# Altium footprint library 逸芬的库鸭.PcbLib: 255 footprints (part 10 of 20)
Each footprint in its own frame and in the unit in brackets; x right, y up, seen from the top. Pads: shape width x height; smd on the part's side, far side on the other; paste and mask are expansions set on the pad; w line width, h text height; cw(c..) or ccw(c..) is an arc to the next point about the centre after c.
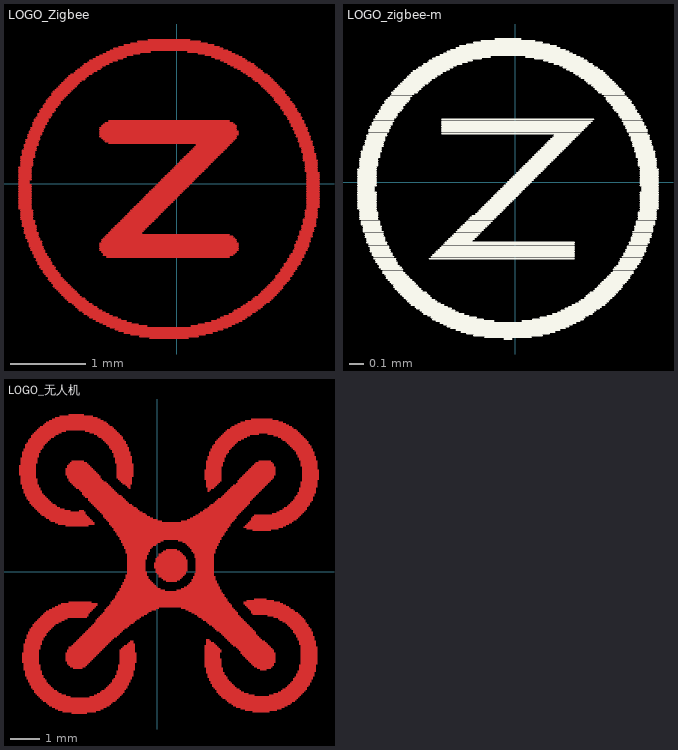
[diagram p9: the footprints below, top view; thin cyan lines are the x and y axes]

## LOGO_Zigbee [mm]
Top Layer:
  lines w0.023: -2.09,-0.33 -1.93,-0.33 ; -2.09,-0.307 -1.93,-0.307 ; -2.09,-0.284 -1.93,-0.284 ; -2.09,-0.262 -1.93,-0.262 ; -2.09,-0.239 -1.93,-0.239 ; -2.09,-0.216 -1.93,-0.216 ; -2.09,-0.193 -1.93,-0.193 ; -2.09,-0.17 -1.93,-0.17 ; -2.09,-0.147 -1.93,-0.147 ; -2.09,-0.124 -1.93,-0.124 ; -2.09,-0.102 -1.93,-0.102 ; -2.09,-0.079 -1.93,-0.079 ; -2.09,-0.056 -1.93,-0.056 ; -2.09,-0.033 -1.93,-0.033 ; -2.09,-0.01 -1.93,-0.01 ; -2.09,0.013 -1.953,0.013 ; -2.09,0.036 -1.953,0.036 ; -2.09,0.058 -1.93,0.058 ; -2.09,0.081 -1.93,0.081 ; -2.09,0.104 -1.93,0.104 ; -2.09,0.127 -1.93,0.127 ; -2.09,0.15 -1.93,0.15 ; -2.09,0.173 -1.93,0.173 ; -2.09,0.196 -1.93,0.196 ; -2.09,0.218 -1.93,0.218 ; -2.068,-0.467 -1.908,-0.467 ; -2.068,-0.445 -1.908,-0.445 ; -2.068,-0.422 -1.908,-0.422 ; -2.068,-0.399 -1.908,-0.399 ; -2.068,-0.376 -1.908,-0.376 ; -2.068,-0.353 -1.908,-0.353 ; -2.068,0.241 -1.908,0.241 ; -2.068,0.264 -1.908,0.264 ; -2.068,0.287 -1.908,0.287 ; -2.068,0.31 -1.908,0.31 ; -2.068,0.333 -1.908,0.333 ; -2.068,0.356 -1.885,0.356 ; -2.045,-0.559 -1.862,-0.559 ; -2.045,-0.536 -1.885,-0.536 ; -2.045,-0.513 -1.885,-0.513 ; -2.045,-0.49 -1.885,-0.49 ; -2.045,0.378 -1.885,0.378 ; -2.045,0.401 -1.885,0.401 ; -2.045,0.424 -1.885,0.424 ; -2.045,0.447 -1.862,0.447 ; -2.022,-0.65 -1.839,-0.65 ; -2.022,-0.627 -1.862,-0.627 ; -2.022,-0.605 -1.862,-0.605 ; -2.022,-0.582 -1.862,-0.582 ; -2.022,0.47 -1.862,0.47 ; -2.022,0.493 -1.862,0.493 ; -2.022,0.516 -1.839,0.516 ; -1.999,-0.719 -1.816,-0.719 ; -1.999,-0.696 -1.839,-0.696 ; -1.999,-0.673 -1.839,-0.673 ; -1.999,0.538 -1.839,0.538 ; -1.999,0.561 -1.839,0.561 ; -1.999,0.584 -1.816,0.584 ; -1.976,-0.765 -1.793,-0.765 ; -1.976,-0.742 -1.816,-0.742 ; -1.976,0.607 -1.816,0.607 ; -1.976,0.63 -1.816,0.63 ; -1.976,0.653 -1.793,0.653 ; -1.953,-0.833 -1.77,-0.833 ; -1.953,-0.81 -1.793,-0.81 ; -1.953,-0.787 -1.793,-0.787 ; -1.953,0.676 -1.793,0.676 ; -1.953,0.699 -1.77,0.699 ; -1.93,-0.879 -1.748,-0.879 ; -1.93,-0.856 -1.77,-0.856 ; -1.93,0.721 -1.77,0.721 ; -1.93,0.744 -1.748,0.744 ; -1.908,-0.925 -1.725,-0.925 ; -1.908,-0.902 -1.748,-0.902 ; -1.908,0.767 -1.748,0.767 ; -1.908,0.79 -1.725,0.79 ; -1.908,0.813 -1.725,0.813 ; -1.885,-0.97 -1.702,-0.97 ; -1.885,-0.947 -1.725,-0.947 ; -1.885,0.836 -1.702,0.836 ; -1.885,0.859 -1.702,0.859 ; -1.862,-1.016 -1.679,-1.016 ; -1.862,-0.993 -1.679,-0.993 ; -1.862,0.881 -1.679,0.881 ; -1.839,-1.062 -1.656,-1.062 ; -1.839,-1.039 -1.656,-1.039 ; -1.839,0.904 -1.656,0.904 ; -1.839,0.927 -1.656,0.927 ; -1.816,-1.107 -1.61,-1.107 ; -1.816,-1.085 -1.633,-1.085 ; -1.816,0.95 -1.633,0.95 ; -1.816,0.973 -1.61,0.973 ; -1.793,-1.13 -1.61,-1.13 ; -1.793,0.996 -1.61,0.996 ; -1.77,-1.176 -1.565,-1.176 ; -1.77,-1.153 -1.587,-1.153 ; -1.77,1.019 -1.587,1.019 ; -1.77,1.041 -1.565,1.041 ; -1.748,-1.199 -1.542,-1.199 ; -1.748,1.064 -1.542,1.064 ; -1.725,-1.222 -1.542,-1.222 ; -1.725,1.087 -1.542,1.087 ; -1.725,1.11 -1.519,1.11 ; -1.702,-1.267 -1.496,-1.267 ; -1.702,-1.245 -1.519,-1.245 ; -1.702,1.133 -1.496,1.133 ; -1.679,-1.29 -1.473,-1.29 ; -1.679,1.156 -1.473,1.156 ; -1.656,-1.313 -1.45,-1.313 ; -1.656,1.179 -1.45,1.179 ; -1.656,1.201 -1.427,1.201 ; -1.633,-1.359 -1.405,-1.359 ; -1.633,-1.336 -1.427,-1.336 ; -1.633,1.224 -1.405,1.224 ; -1.61,-1.382 -1.382,-1.382 ; -1.61,1.247 -1.382,1.247 ; -1.587,-1.405 -1.359,-1.405 ; -1.587,1.27 -1.359,1.27 ; -1.565,-1.427 -1.336,-1.427 ; -1.565,1.293 -1.336,1.293 ; -1.542,-1.45 -1.313,-1.45 ; -1.542,1.316 -1.313,1.316 ; -1.519,-1.473 -1.29,-1.473 ; -1.519,1.339 -1.29,1.339 ; -1.496,-1.496 -1.267,-1.496 ; -1.496,1.361 -1.267,1.361 ; -1.473,-1.519 -1.222,-1.519 ; -1.473,1.384 -1.222,1.384 ; -1.45,-1.542 -1.199,-1.542 ; -1.45,1.407 -1.199,1.407 ; -1.427,-1.565 -1.176,-1.565 ; -1.427,1.43 -1.176,1.43 ; -1.405,1.453 -1.13,1.453 ; -1.382,-1.587 -1.13,-1.587 ; -1.359,-1.61 -1.107,-1.61 ; -1.359,1.476 -1.107,1.476 ; -1.336,-1.633 -1.062,-1.633 ; -1.336,1.499 -1.062,1.499 ; -1.313,-1.656 -1.039,-1.656 ; -1.313,1.521 -1.016,1.521 ; -1.29,-1.679 -0.993,-1.679 ; -1.267,1.544 -0.993,1.544 ; -1.245,-1.702 -0.947,-1.702 ; -1.245,1.567 -0.947,1.567 ; -1.222,-1.725 -0.902,-1.725 ; -1.222,1.59 -0.902,1.59 ; -1.176,-1.748 -0.856,-1.748 ; -1.176,1.613 -0.856,1.613 ; -1.153,-1.77 -0.787,-1.77 ; -1.153,1.636 -0.787,1.636 ; -1.107,-1.793 -0.742,-1.793 ; -1.107,1.659 -0.719,1.659 ; -1.062,-1.816 -0.673,-1.816 ; -1.062,1.681 -0.673,1.681 ; -1.016,-1.839 -0.605,-1.839 ; -1.016,-0.879 0.813,-0.879 ; -1.016,-0.856 0.813,-0.856 ; -1.016,-0.833 0.813,-0.833 ; -1.016,-0.81 0.813,-0.81 ; -1.016,-0.787 0.813,-0.787 ; -1.016,0.63 0.79,0.63 ; -1.016,0.653 0.813,0.653 ; -1.016,0.676 0.813,0.676 ; -1.016,0.699 0.813,0.699 ; -1.016,0.721 0.79,0.721 ; -1.016,0.744 0.79,0.744 ; -1.016,1.704 -0.582,1.704 ; -0.993,-0.902 0.79,-0.902 ; -0.993,-0.765 0.79,-0.765 ; -0.993,-0.742 0.79,-0.742 ; -0.993,0.607 0.79,0.607 ; -0.993,0.767 0.79,0.767 ; -0.97,-1.862 -0.513,-1.862 ; -0.97,-0.947 0.744,-0.947 ; -0.97,-0.925 0.767,-0.925 ; -0.97,-0.719 0.767,-0.719 ; -0.97,0.584 0.767,0.584 ; -0.97,0.79 0.767,0.79 ; -0.97,1.727 -0.49,1.727 ; -0.947,-0.696 0.744,-0.696 ; -0.947,0.561 0.744,0.561 ; -0.947,0.813 0.744,0.813 ; -0.925,-1.885 -0.399,-1.885 ; -0.925,-0.97 0.699,-0.97 ; -0.925,-0.673 0.699,-0.673 ; -0.925,1.75 -0.353,1.75 ; -0.902,-0.65 -0.467,-0.65 ; -0.902,0.538 0.721,0.538 ; -0.902,0.836 0.699,0.836 ; -0.879,-1.908 0.676,-1.908 ; -0.879,-0.627 -0.445,-0.627 ; -0.879,1.773 0.676,1.773 ; -0.856,-0.605 -0.422,-0.605 ; -0.833,-0.582 -0.399,-0.582 ; -0.833,1.796 0.607,1.796 ; -0.81,-1.93 0.607,-1.93 ; -0.81,-0.559 -0.376,-0.559 ; -0.787,-0.536 -0.353,-0.536 ; -0.765,-1.953 0.538,-1.953 ; -0.765,-0.513 -0.33,-0.513 ; -0.765,1.819 0.561,1.819 ; -0.742,-0.49 -0.307,-0.49 ; -0.719,-0.467 -0.284,-0.467 ; -0.696,-1.976 0.47,-1.976 ; -0.696,-0.445 -0.262,-0.445 ; -0.696,1.841 0.493,1.841 ; -0.673,-0.422 -0.239,-0.422 ; -0.65,-0.399 -0.216,-0.399 ; -0.627,-0.376 -0.193,-0.376 ; -0.605,-1.999 0.378,-1.999 ; -0.605,-0.353 -0.17,-0.353 ; -0.605,1.864 0.401,1.864 ; -0.582,-0.33 -0.147,-0.33 ; -0.559,-0.307 -0.124,-0.307 ; -0.536,-0.284 -0.102,-0.284 ; -0.513,-0.262 -0.079,-0.262 ; -0.513,1.887 0.31,1.887 ; -0.49,-2.022 0.287,-2.022 ; -0.49,-0.239 -0.056,-0.239 ; -0.467,-0.216 -0.033,-0.216 ; -0.445,-0.193 -0.01,-0.193 ; -0.422,-0.17 0.013,-0.17 ; -0.399,-0.147 0.036,-0.147 ; -0.376,-0.124 0.058,-0.124 ; -0.376,1.91 0.173,1.91 ; -0.353,-2.045 0.15,-2.045 ; -0.353,-0.102 0.081,-0.102 ; -0.33,-0.079 0.104,-0.079 ; -0.307,-0.056 0.127,-0.056 ; -0.284,-0.033 0.15,-0.033 ; -0.262,-0.01 0.173,-0.01 ; -0.239,0.013 0.196,0.013 ; -0.216,0.036 0.218,0.036 ; -0.193,0.058 0.241,0.058 ; -0.17,0.081 0.264,0.081 ; -0.147,0.104 0.287,0.104 ; -0.124,0.127 0.31,0.127 ; -0.102,0.15 0.333,0.15 ; -0.079,0.173 0.356,0.173 ; -0.056,0.196 0.378,0.196 ; -0.033,0.218 0.401,0.218 ; -0.01,0.241 0.424,0.241 ; 0.013,0.264 0.447,0.264 ; 0.036,0.287 0.47,0.287 ; 0.058,0.31 0.493,0.31 ; 0.081,0.333 0.516,0.333 ; 0.104,0.356 0.538,0.356 ; 0.127,0.378 0.561,0.378 ; 0.15,0.401 0.584,0.401 ; 0.15,1.75 0.721,1.75 ; 0.173,0.424 0.607,0.424 ; 0.196,-1.885 0.721,-1.885 ; 0.196,0.447 0.63,0.447 ; 0.218,0.47 0.653,0.47 ; 0.241,0.493 0.676,0.493 ; 0.264,0.516 0.699,0.516 ; 0.287,-1.862 0.767,-1.862 ; 0.287,1.727 0.767,1.727 ; 0.378,-1.839 0.813,-1.839 ; 0.378,1.704 0.813,1.704 ; 0.47,-1.816 0.859,-1.816 ; 0.47,1.681 0.859,1.681 ; 0.516,1.659 0.904,1.659 ; 0.538,-1.793 0.904,-1.793 ; 0.584,-1.77 0.927,-1.77 ; 0.584,1.636 0.927,1.636 ; 0.63,-1.748 0.973,-1.748 ; 0.63,1.613 0.973,1.613 ; 0.676,1.59 1.019,1.59 ; 0.699,-1.725 0.996,-1.725 ; 0.721,1.567 1.041,1.567 ; 0.744,-1.702 1.041,-1.702 ; 0.767,-1.679 1.064,-1.679 ; 0.767,1.544 1.064,1.544 ; 0.813,-1.656 1.11,-1.656 ; 0.813,1.521 1.11,1.521 ; 0.859,-1.633 1.133,-1.633 ; 0.859,1.499 1.133,1.499 ; 0.881,-1.61 1.156,-1.61 ; 0.881,1.476 1.156,1.476 ; 0.927,-1.587 1.179,-1.587 ; 0.927,1.453 1.201,1.453 ; 0.95,-1.565 1.224,-1.565 ; 0.95,1.43 1.224,1.43 ; 0.996,-1.542 1.247,-1.542 ; 0.996,1.407 1.247,1.407 ; 1.019,-1.519 1.27,-1.519 ; 1.019,1.384 1.27,1.384 ; 1.041,-1.496 1.293,-1.496 ; 1.041,1.361 1.293,1.361 ; 1.087,-1.473 1.316,-1.473 ; 1.087,1.339 1.316,1.339 ; 1.11,-1.45 1.339,-1.45 ; 1.11,1.316 1.339,1.316 ; 1.133,-1.427 1.361,-1.427 ; 1.133,1.293 1.361,1.293 ; 1.156,-1.405 1.384,-1.405 ; 1.156,1.27 1.384,1.27 ; 1.179,-1.382 1.407,-1.382 ; 1.179,1.247 1.407,1.247 ; 1.201,-1.359 1.407,-1.359 ; 1.201,1.224 1.43,1.224 ; 1.224,-1.336 1.43,-1.336 ; 1.224,1.201 1.43,1.201 ; 1.247,-1.313 1.453,-1.313 ; 1.247,1.179 1.453,1.179 ; 1.27,-1.29 1.476,-1.29 ; 1.27,1.156 1.476,1.156 ; 1.293,-1.267 1.499,-1.267 ; 1.293,1.11 1.499,1.11 ; 1.293,1.133 1.499,1.133 ; 1.316,-1.245 1.499,-1.245 ; 1.316,-1.222 1.521,-1.222 ; 1.316,1.087 1.521,1.087 ; 1.339,-1.199 1.544,-1.199 ; 1.339,1.064 1.544,1.064 ; 1.361,-1.176 1.544,-1.176 ; 1.361,1.041 1.567,1.041 ; 1.384,-1.153 1.567,-1.153 ; 1.384,-1.13 1.59,-1.13 ; 1.384,0.996 1.59,0.996 ; 1.384,1.019 1.567,1.019 ; 1.407,-1.107 1.59,-1.107 ; 1.407,0.973 1.59,0.973 ; 1.43,-1.085 1.613,-1.085 ; 1.43,-1.062 1.636,-1.062 ; 1.43,0.927 1.636,0.927 ; 1.43,0.95 1.613,0.95 ; 1.453,-1.039 1.636,-1.039 ; 1.453,0.904 1.636,0.904 ; 1.476,-1.016 1.659,-1.016 ; 1.476,-0.993 1.659,-0.993 ; 1.476,0.859 1.659,0.859 ; 1.476,0.881 1.659,0.881 ; 1.499,-0.97 1.681,-0.97 ; 1.499,-0.947 1.681,-0.947 ; 1.499,0.813 1.681,0.813 ; 1.499,0.836 1.681,0.836 ; 1.521,-0.925 1.704,-0.925 ; 1.521,0.767 1.704,0.767 ; 1.521,0.79 1.704,0.79 ; 1.544,-0.902 1.704,-0.902 ; 1.544,-0.879 1.727,-0.879 ; 1.544,0.721 1.727,0.721 ; 1.544,0.744 1.727,0.744 ; 1.567,-0.856 1.727,-0.856 ; 1.567,-0.833 1.75,-0.833 ; 1.567,-0.81 1.75,-0.81 ; 1.567,0.676 1.75,0.676 ; 1.567,0.699 1.727,0.699 ; 1.59,-0.787 1.75,-0.787 ; 1.59,-0.765 1.773,-0.765 ; 1.59,0.63 1.773,0.63 ; 1.59,0.653 1.75,0.653 ; 1.613,-0.742 1.773,-0.742 ; 1.613,-0.719 1.773,-0.719 ; 1.613,-0.696 1.796,-0.696 ; 1.613,0.561 1.796,0.561 ; 1.613,0.584 1.773,0.584 ; 1.613,0.607 1.773,0.607 ; 1.636,-0.673 1.796,-0.673 ; 1.636,-0.65 1.796,-0.65 ; 1.636,-0.627 1.819,-0.627 ; 1.636,0.493 1.819,0.493 ; 1.636,0.516 1.796,0.516 ; 1.636,0.538 1.796,0.538 ; 1.659,-0.605 1.819,-0.605 ; 1.659,-0.582 1.819,-0.582 ; 1.659,-0.559 1.841,-0.559 ; 1.659,0.424 1.819,0.424 ; 1.659,0.447 1.819,0.447 ; 1.659,0.47 1.819,0.47 ; 1.681,-0.536 1.841,-0.536 ; 1.681,-0.513 1.841,-0.513 ; 1.681,-0.49 1.841,-0.49 ; 1.681,-0.467 1.841,-0.467 ; 1.681,0.31 1.864,0.31 ; 1.681,0.333 1.841,0.333 ; 1.681,0.356 1.841,0.356 ; 1.681,0.378 1.841,0.378 ; 1.681,0.401 1.841,0.401 ; 1.704,-0.445 1.864,-0.445 ; 1.704,-0.422 1.864,-0.422 ; 1.704,-0.399 1.864,-0.399 ; 1.704,-0.376 1.864,-0.376 ; 1.704,-0.353 1.864,-0.353 ; 1.704,0.173 1.864,0.173 ; 1.704,0.196 1.864,0.196 ; 1.704,0.218 1.864,0.218 ; 1.704,0.241 1.864,0.241 ; 1.704,0.264 1.864,0.264 ; 1.704,0.287 1.864,0.287 ; 1.727,-0.33 1.864,-0.33 ; 1.727,-0.307 1.887,-0.307 ; 1.727,-0.284 1.887,-0.284 ; 1.727,-0.262 1.887,-0.262 ; 1.727,-0.239 1.887,-0.239 ; 1.727,-0.216 1.887,-0.216 ; 1.727,-0.193 1.887,-0.193 ; 1.727,-0.17 1.887,-0.17 ; 1.727,-0.147 1.887,-0.147 ; 1.727,-0.124 1.887,-0.124 ; 1.727,-0.102 1.887,-0.102 ; 1.727,-0.079 1.887,-0.079 ; 1.727,-0.056 1.887,-0.056 ; 1.727,-0.033 1.887,-0.033 ; 1.727,-0.01 1.887,-0.01 ; 1.727,0.013 1.887,0.013 ; 1.727,0.036 1.887,0.036 ; 1.727,0.058 1.887,0.058 ; 1.727,0.081 1.887,0.081 ; 1.727,0.104 1.887,0.104 ; 1.727,0.127 1.887,0.127 ; 1.727,0.15 1.887,0.15

## LOGO_zigbee-m [mm]
Top Overlay:
  drawing of 397 lines, arcs and shapes, not listed

## LOGO_无人机 [mm]
Top Layer:
  lines w0.051: -4.674,3.277 -4.115,3.277 ; -4.674,3.327 -4.115,3.327 ; -4.674,3.378 -4.115,3.378 ; -4.674,3.429 -4.115,3.429 ; -4.674,3.48 -4.115,3.48 ; -4.674,3.531 -4.115,3.531 ; -4.674,3.581 -4.115,3.581 ; -4.623,2.972 -4.064,2.972 ; -4.623,3.023 -4.064,3.023 ; -4.623,3.073 -4.064,3.073 ; -4.623,3.124 -4.064,3.124 ; -4.623,3.175 -4.115,3.175 ; -4.623,3.226 -4.115,3.226 ; -4.623,3.632 -4.115,3.632 ; -4.623,3.683 -4.064,3.683 ; -4.623,3.734 -4.064,3.734 ; -4.623,3.785 -4.064,3.785 ; -4.623,3.835 -4.064,3.835 ; -4.572,-3.073 -4.013,-3.073 ; -4.572,-3.023 -4.013,-3.023 ; -4.572,-2.972 -4.013,-2.972 ; -4.572,-2.921 -4.013,-2.921 ; -4.572,-2.87 -4.013,-2.87 ; -4.572,-2.819 -4.013,-2.819 ; -4.572,-2.769 -4.013,-2.769 ; -4.572,2.819 -3.962,2.819 ; -4.572,2.87 -4.013,2.87 ; -4.572,2.921 -4.013,2.921 ; -4.572,3.886 -4.013,3.886 ; -4.572,3.937 -4.013,3.937 ; -4.572,3.988 -4.013,3.988 ; -4.572,4.039 -3.962,4.039 ; -4.521,-3.327 -3.962,-3.327 ; -4.521,-3.277 -3.962,-3.277 ; -4.521,-3.226 -3.962,-3.226 ; -4.521,-3.175 -3.962,-3.175 ; -4.521,-3.124 -4.013,-3.124 ; -4.521,-2.718 -4.013,-2.718 ; -4.521,-2.667 -4.013,-2.667 ; -4.521,-2.616 -3.962,-2.616 ; -4.521,-2.565 -3.962,-2.565 ; -4.521,-2.515 -3.962,-2.515 ; -4.521,-2.464 -3.912,-2.464 ; -4.521,2.667 -3.912,2.667 ; -4.521,2.718 -3.912,2.718 ; -4.521,2.769 -3.962,2.769 ; -4.521,4.089 -3.962,4.089 ; -4.521,4.14 -3.912,4.14 ; -4.47,-3.531 -3.861,-3.531 ; -4.47,-3.48 -3.912,-3.48 ; -4.47,-3.429 -3.912,-3.429 ; -4.47,-3.378 -3.912,-3.378 ; -4.47,-2.413 -3.912,-2.413 ; -4.47,-2.362 -3.912,-2.362 ; -4.47,-2.311 -3.861,-2.311 ; -4.47,2.565 -3.81,2.565 ; -4.47,2.616 -3.861,2.616 ; -4.47,4.191 -3.861,4.191 ; -4.47,4.242 -3.861,4.242 ; -4.47,4.293 -3.81,4.293 ; -4.42,-3.632 -3.81,-3.632 ; -4.42,-3.581 -3.861,-3.581 ; -4.42,-2.261 -3.861,-2.261 ; -4.42,-2.21 -3.81,-2.21 ; -4.42,-2.159 -3.759,-2.159 ; -4.42,2.464 -3.708,2.464 ; -4.42,2.515 -3.759,2.515 ; -4.42,4.343 -3.759,4.343 ; -4.369,-3.734 -3.759,-3.734 ; -4.369,-3.683 -3.759,-3.683 ; -4.369,-2.108 -3.759,-2.108 ; -4.369,-2.057 -3.708,-2.057 ; -4.369,2.413 -3.658,2.413 ; -4.369,4.394 -3.708,4.394 ; -4.369,4.445 -3.658,4.445 ; -4.318,-3.835 -3.658,-3.835 ; -4.318,-3.785 -3.708,-3.785 ; -4.318,-2.007 -3.658,-2.007 ; -4.318,-1.956 -3.607,-1.956 ; -4.318,2.311 -3.556,2.311 ; -4.318,2.362 -3.607,2.362 ; -4.318,4.496 -3.607,4.496 ; -4.267,-3.937 -3.556,-3.937 ; -4.267,-3.886 -3.607,-3.886 ; -4.267,-1.905 -3.556,-1.905 ; -4.267,2.261 -3.454,2.261 ; -4.267,4.547 -3.505,4.547 ; -4.267,4.597 -3.454,4.597 ; -4.216,-3.988 -3.505,-3.988 ; -4.216,-1.854 -3.505,-1.854 ; -4.216,-1.803 -3.454,-1.803 ; -4.216,2.21 -3.404,2.21 ; -4.216,4.648 -3.353,4.648 ; -4.166,-4.089 -3.353,-4.089 ; -4.166,-4.039 -3.404,-4.039 ; -4.166,-1.753 -3.353,-1.753 ; -4.166,2.159 -3.302,2.159 ; -4.166,4.699 -3.251,4.699 ; -4.115,-4.14 -3.251,-4.14 ; -4.115,-1.702 -3.251,-1.702 ; -4.115,2.108 -3.15,2.108 ; -4.115,4.75 -3.099,4.75 ; -4.064,-4.191 -3.099,-4.191 ; -4.064,-1.651 -3.15,-1.651 ; -4.064,2.057 -2.946,2.057 ; -4.064,4.801 -1.422,4.801 ; -4.013,-4.242 -2.946,-4.242 ; -4.013,-1.6 -3.048,-1.6 ; -4.013,2.007 -2.438,2.007 ; -4.013,4.851 -1.473,4.851 ; -3.962,-4.293 -1.321,-4.293 ; -3.962,-1.549 -2.388,-1.549 ; -3.962,1.956 -2.438,1.956 ; -3.962,4.902 -1.524,4.902 ; -3.912,-4.343 -1.372,-4.343 ; -3.912,-1.499 -2.337,-1.499 ; -3.912,1.905 -2.388,1.905 ; -3.861,-4.394 -1.422,-4.394 ; -3.861,-1.448 -2.337,-1.448 ; -3.861,4.953 -1.626,4.953 ; -3.81,-1.397 -2.286,-1.397 ; -3.81,1.854 -2.337,1.854 ; -3.81,5.004 -1.676,5.004 ; -3.759,-4.445 -1.524,-4.445 ; -3.759,-1.346 -2.235,-1.346 ; -3.759,1.803 -2.286,1.803 ; -3.759,5.055 -1.727,5.055 ; -3.708,-4.496 -1.575,-4.496 ; -3.658,-4.547 -1.626,-4.547 ; -3.658,-1.295 -2.184,-1.295 ; -3.658,1.753 -2.235,1.753 ; -3.658,5.105 -1.829,5.105 ; -3.607,1.702 -2.184,1.702 ; -3.556,-4.597 -1.727,-4.597 ; -3.556,-1.245 -2.134,-1.245 ; -3.556,5.156 -1.93,5.156 ; -3.454,-4.648 -1.829,-4.648 ; -3.454,-1.194 -2.083,-1.194 ; -3.454,1.651 -2.134,1.651 ; -3.454,5.207 -2.032,5.207 ; -3.353,-4.699 -1.93,-4.699 ; -3.353,-1.143 -2.032,-1.143 ; -3.353,1.6 -2.134,1.6 ; -3.302,5.258 -2.184,5.258 ; -3.251,-1.092 -2.032,-1.092 ; -3.2,-4.75 -2.083,-4.75 ; -3.099,-3.023 -2.235,-3.023 ; -3.099,-2.972 -2.184,-2.972 ; -3.099,-2.921 -2.134,-2.921 ; -3.099,-2.87 -2.083,-2.87 ; -3.099,-2.819 -2.032,-2.819 ; -3.099,-2.769 -1.981,-2.769 ; -3.099,1.549 -2.337,1.549 ; -3.099,3.277 -1.981,3.277 ; -3.099,3.327 -2.032,3.327 ; -3.099,3.378 -2.083,3.378 ; -3.099,3.429 -2.134,3.429 ; -3.099,3.48 -2.184,3.48 ; -3.048,-3.124 -2.337,-3.124 ; -3.048,-3.073 -2.286,-3.073 ; -3.048,-2.718 -1.93,-2.718 ; -3.048,-2.667 -1.88,-2.667 ; -3.048,3.175 -1.93,3.175 ; -3.048,3.226 -1.93,3.226 ; -3.048,3.531 -2.235,3.531 ; -3.048,3.581 -2.286,3.581 ; -2.997,-3.175 -2.388,-3.175 ; -2.997,-2.616 -1.829,-2.616 ; -2.997,-2.565 -1.778,-2.565 ; -2.997,-1.041 -2.235,-1.041 ; -2.997,3.073 -1.829,3.073 ; -2.997,3.124 -1.88,3.124 ; -2.997,3.632 -2.337,3.632 ; -2.997,5.309 -2.489,5.309 ; -2.946,-3.226 -2.438,-3.226 ; -2.946,3.023 -1.727,3.023 ; -2.946,3.683 -2.388,3.683 ; -2.896,-4.801 -2.388,-4.801 ; -2.896,-2.515 -1.727,-2.515 ; -2.896,2.972 -1.676,2.972 ; -2.896,3.734 -2.489,3.734 ; -2.845,-3.277 -2.54,-3.277 ; -2.845,-2.464 -1.676,-2.464 ; -2.845,2.921 -1.626,2.921 ; -2.794,-2.413 -1.626,-2.413 ; -2.794,2.87 -1.575,2.87 ; -2.743,-2.362 -1.575,-2.362 ; -2.743,2.819 -1.524,2.819 ; -2.692,-2.311 -1.524,-2.311 ; -2.642,-2.261 -1.473,-2.261 ; -2.642,2.057 -2.489,2.057 ; -2.642,2.769 -1.473,2.769 ; -2.591,-2.21 -1.372,-2.21 ; -2.591,2.718 -1.422,2.718 ; -2.54,-2.159 -1.321,-2.159 ; -2.54,2.616 -1.321,2.616 ; -2.54,2.667 -1.372,2.667 ; -2.489,-2.108 -1.27,-2.108 ; -2.489,2.565 -1.219,2.565 ; -2.438,-2.057 -1.219,-2.057 ; -2.438,2.515 -1.168,2.515 ; -2.438,4.75 -1.372,4.75 ; -2.388,-2.007 -1.168,-2.007 ; -2.337,-1.956 -1.118,-1.956 ; -2.337,2.413 -1.067,2.413 ; -2.337,2.464 -1.118,2.464 ; -2.286,-4.242 -1.27,-4.242 ; -2.286,-1.905 -1.016,-1.905 ; -2.286,2.362 -1.016,2.362 ; -2.286,4.699 -1.321,4.699 ; -2.235,-1.854 -0.965,-1.854 ; -2.235,2.311 -0.965,2.311 ; -2.184,-1.803 -0.914,-1.803 ; -2.184,2.261 -0.864,2.261 ; -2.134,-4.191 -1.219,-4.191 ; -2.134,-1.753 -0.813,-1.753 ; -2.134,2.21 -0.813,2.21 ; -2.134,4.648 -1.27,4.648 ; -2.083,-1.702 -0.762,-1.702 ; -2.083,-1.651 -0.711,-1.651 ; -2.083,2.159 -0.711,2.159 ; -2.032,-4.14 -1.168,-4.14 ; -2.032,-1.6 -0.61,-1.6 ; -2.032,2.108 -0.66,2.108 ; -2.032,4.597 -1.219,4.597 ; -1.981,-1.549 -0.559,-1.549 ; -1.981,2.057 -0.61,2.057 ; -1.981,4.547 -1.168,4.547 ; -1.93,-4.089 -1.118,-4.089 ; -1.93,-1.499 -0.457,-1.499 ; -1.93,2.007 -0.508,2.007 ; -1.88,-4.039 -1.118,-4.039 ; -1.88,-1.448 -0.356,-1.448 ; -1.88,1.956 -0.406,1.956 ; -1.88,4.496 -1.168,4.496 ; -1.829,-1.397 -0.305,-1.397 ; -1.829,1.854 -0.254,1.854 ; -1.829,1.905 -0.356,1.905 ; -1.829,4.445 -1.118,4.445 ; -1.778,-3.988 -1.067,-3.988 ; -1.778,-1.346 -0.203,-1.346 ; -1.778,-1.295 -0.051,-1.295 ; -1.778,1.803 -0.152,1.803 ; -1.778,4.394 -1.067,4.394 ; -1.727,-3.937 -1.016,-3.937 ; -1.727,-1.245 0.051,-1.245 ; -1.727,1.753 0,1.753 ; -1.727,4.343 -1.067,4.343 ; -1.676,-3.886 -1.016,-3.886 ; -1.676,-1.194 2.54,-1.194 ; -1.676,1.702 0.152,1.702 ; -1.676,4.293 -1.016,4.293 ; -1.626,-3.835 -0.965,-3.835 ; -1.626,-1.143 2.54,-1.143 ; -1.626,1.6 2.489,1.6 ; -1.626,1.651 2.54,1.651 ; -1.626,4.191 -0.965,4.191 ; -1.626,4.242 -1.016,4.242 ; -1.575,-3.785 -0.965,-3.785 ; -1.575,-1.092 2.489,-1.092 ; -1.575,-1.041 2.438,-1.041 ; -1.575,1.549 2.489,1.549 ; -1.575,4.14 -0.965,4.14 ; -1.524,-3.734 -0.914,-3.734 ; -1.524,-3.683 -0.914,-3.683 ; -1.524,-0.991 2.388,-0.991 ; -1.524,1.499 2.438,1.499 ; -1.524,4.039 -0.914,4.039 ; -1.524,4.089 -0.965,4.089 ; -1.473,-3.632 -0.864,-3.632 ; -1.473,-0.94 2.388,-0.94 ; -1.473,1.397 2.388,1.397 ; -1.473,1.448 2.388,1.448 ; -1.473,3.886 -0.864,3.886 ; -1.473,3.937 -0.914,3.937 ; -1.473,3.988 -0.914,3.988 ; -1.422,-3.581 -0.864,-3.581 ; -1.422,-3.531 -0.813,-3.531 ; -1.422,-0.889 2.337,-0.889 ; -1.422,-0.838 2.286,-0.838 ; -1.422,1.346 2.337,1.346 ; -1.422,3.683 -0.864,3.683 ; -1.422,3.734 -0.864,3.734 ; -1.422,3.785 -0.864,3.785 ; -1.422,3.835 -0.864,3.835 ; -1.372,-3.48 -0.813,-3.48 ; -1.372,-3.429 -0.813,-3.429 ; -1.372,-3.378 -0.813,-3.378 ; -1.372,-0.787 2.286,-0.787 ; -1.372,-0.737 2.235,-0.737 ; -1.372,1.245 2.286,1.245 ; -1.372,1.295 2.286,1.295 ; -1.372,3.175 -0.864,3.175 ; -1.372,3.226 -0.813,3.226 ; -1.372,3.277 -0.813,3.277 ; -1.372,3.327 -0.813,3.327 ; -1.372,3.378 -0.813,3.378 ; -1.372,3.429 -0.813,3.429 ; -1.372,3.48 -0.813,3.48 ; -1.372,3.531 -0.813,3.531 ; -1.372,3.581 -0.813,3.581 ; -1.372,3.632 -0.813,3.632 ; -1.321,-3.327 -0.762,-3.327 ; -1.321,-3.277 -0.762,-3.277 ; -1.321,-3.226 -0.762,-3.226 ; -1.321,-3.175 -0.762,-3.175 ; -1.321,-0.686 2.184,-0.686 ; -1.321,1.194 2.235,1.194 ; -1.321,3.124 -0.864,3.124 ; -1.27,-3.124 -0.762,-3.124 ; -1.27,-3.073 -0.711,-3.073 ; -1.27,-3.023 -0.711,-3.023 ; -1.27,-2.972 -0.711,-2.972 ; -1.27,-2.921 -0.711,-2.921 ; -1.27,-2.87 -0.711,-2.87 ; -1.27,-2.819 -0.711,-2.819 ; -1.27,-2.769 -0.711,-2.769 ; -1.27,-2.718 -0.762,-2.718 ; -1.27,-2.667 -0.762,-2.667 ; -1.27,-0.635 0.254,-0.635 ; -1.27,-0.584 0.102,-0.584 ; -1.27,1.092 2.184,1.092 ; -1.27,1.143 2.184,1.143 ; -1.27,3.073 -0.864,3.073 ; -1.219,-2.616 -0.762,-2.616 ; -1.219,-0.533 0,-0.533 ; -1.219,-0.483 -0.051,-0.483 ; -1.219,0.991 0.102,0.991 ; -1.219,1.041 0.203,1.041 ; -1.219,3.023 -0.864,3.023 ; -1.168,-2.565 -0.762,-2.565 ; -1.168,-0.432 -0.102,-0.432 ; -1.168,-0.381 -0.152,-0.381 ; -1.168,0.889 -0.051,0.889 ; -1.168,0.94 0,0.94 ; -1.168,2.972 -0.864,2.972 ; -1.118,-2.515 -0.762,-2.515 ; -1.118,-0.33 -0.203,-0.33 ; -1.118,-0.279 -0.254,-0.279 ; -1.118,0.787 -0.203,0.787 ; -1.118,0.838 -0.152,0.838 ; -1.067,-0.229 -0.305,-0.229 ; -1.067,-0.178 -0.305,-0.178 ; -1.067,-0.127 -0.356,-0.127 ; -1.067,0.635 -0.305,0.635 ; -1.067,0.686 -0.254,0.686 ; -1.067,0.737 -0.254,0.737 ; -1.067,2.921 -0.914,2.921 ; -1.016,-2.464 -0.762,-2.464 ; -1.016,-0.076 -0.356,-0.076 ; -1.016,-0.025 -0.356,-0.025 ; -1.016,0.025 -0.406,0.025 ; -1.016,0.076 -0.406,0.076 ; -1.016,0.127 -0.406,0.127 ; -1.016,0.178 -0.406,0.178 ; -1.016,0.229 -0.406,0.229 ; -1.016,0.279 -0.406,0.279 ; -1.016,0.33 -0.406,0.33 ; -1.016,0.381 -0.406,0.381 ; -1.016,0.432 -0.356,0.432 ; -1.016,0.483 -0.356,0.483 ; -1.016,0.533 -0.356,0.533 ; -1.016,0.584 -0.305,0.584 ; -1.016,2.87 -0.914,2.87 ; -0.965,-2.413 -0.813,-2.413 ; -0.965,2.819 -0.914,2.819 ; -0.914,-2.362 -0.813,-2.362 ; -0.102,0.127 1.016,0.127 ; -0.102,0.178 1.016,0.178 ; -0.102,0.229 1.016,0.229 ; -0.102,0.279 1.016,0.279 ; -0.051,-0.025 0.965,-0.025 ; -0.051,0.025 1.016,0.025 ; -0.051,0.076 1.016,0.076 ; -0.051,0.33 1.016,0.33 ; -0.051,0.381 1.016,0.381 ; -0.051,0.432 0.965,0.432 ; 0,-0.076 0.965,-0.076 ; 0,0.483 0.965,0.483 ; 0.051,-0.178 0.864,-0.178 ; 0.051,-0.127 0.914,-0.127 ; 0.051,0.533 0.914,0.533 ; 0.051,0.584 0.864,0.584 ; 0.152,-0.229 0.813,-0.229 ; 0.152,0.635 0.813,0.635 ; 0.203,-0.279 0.762,-0.279 ; 0.203,0.686 0.762,0.686 ; 0.305,-0.33 0.66,-0.33 ; 0.305,0.737 0.66,0.737 ; 0.66,-0.635 2.184,-0.635 ; 0.711,1.041 2.134,1.041 ; 0.813,-1.245 2.591,-1.245 ; 0.813,-0.584 2.134,-0.584 ; 0.813,1.702 2.591,1.702 ; 0.864,0.991 2.134,0.991 ; 0.914,-0.533 2.134,-0.533 ; 0.965,-1.295 2.642,-1.295 ; 0.965,0.94 2.083,0.94 ; 1.016,-0.483 2.083,-0.483 ; 1.016,0.889 2.083,0.889 ; 1.016,1.753 2.642,1.753 ; 1.067,-1.346 2.692,-1.346 ; 1.067,-0.432 2.083,-0.432 ; 1.067,0.838 2.032,0.838 ; 1.118,-0.381 2.032,-0.381 ; 1.118,0.787 2.032,0.787 ; 1.118,1.803 2.692,1.803 ; 1.168,-1.397 2.743,-1.397 ; 1.168,-0.33 2.032,-0.33 ; 1.168,-0.279 1.981,-0.279 ; 1.168,0.686 1.981,0.686 ; 1.168,0.737 1.981,0.737 ; 1.219,-0.229 1.981,-0.229 ; 1.219,-0.178 1.981,-0.178 ; 1.219,0.635 1.981,0.635 ; 1.219,1.854 2.692,1.854 ; 1.27,-1.448 2.743,-1.448 ; 1.27,-0.127 1.93,-0.127 ; 1.27,-0.076 1.93,-0.076 ; 1.27,0.483 1.93,0.483 ; 1.27,0.533 1.93,0.533 ; 1.27,0.584 1.93,0.584 ; 1.321,-0.025 1.93,-0.025 ; 1.321,0.025 1.93,0.025 ; 1.321,0.076 1.93,0.076 ; 1.321,0.127 1.93,0.127 ; 1.321,0.178 1.93,0.178 ; 1.321,0.229 1.93,0.229 ; 1.321,0.279 1.93,0.279 ; 1.321,0.33 1.93,0.33 ; 1.321,0.381 1.93,0.381 ; 1.321,0.432 1.93,0.432 ; 1.321,1.905 2.743,1.905 ; 1.372,-1.499 2.794,-1.499 ; 1.422,-1.549 2.845,-1.549 ; 1.422,1.956 2.794,1.956 ; 1.473,2.007 2.845,2.007 ; 1.524,-1.6 2.896,-1.6 ; 1.575,-1.651 2.946,-1.651 ; 1.575,2.057 2.896,2.057 ; 1.626,-3.226 2.184,-3.226 ; 1.626,-3.175 2.184,-3.175 ; 1.626,-3.124 2.184,-3.124 ; 1.626,-3.073 2.184,-3.073 ; 1.626,-3.023 2.184,-3.023 ; 1.626,-2.972 2.184,-2.972 ; 1.626,-2.921 2.134,-2.921 ; 1.626,-2.87 2.134,-2.87 ; 1.626,-2.819 2.134,-2.819 ; 1.626,-2.769 2.134,-2.769 ; 1.626,-2.718 2.184,-2.718 ; 1.626,-2.667 2.184,-2.667 ; 1.626,-2.616 2.134,-2.616 ; 1.626,-2.565 2.083,-2.565 ; 1.626,-2.515 2.032,-2.515 ; 1.626,2.108 2.946,2.108 ; 1.626,3.124 2.184,3.124 ; 1.626,3.175 2.184,3.175 ; 1.626,3.226 2.184,3.226 ; 1.626,3.277 2.184,3.277 ; 1.626,3.327 2.184,3.327 ; 1.626,3.378 2.184,3.378 ; 1.626,3.429 2.184,3.429 ; 1.676,-3.429 2.286,-3.429 ; 1.676,-3.378 2.235,-3.378 ; 1.676,-3.327 2.235,-3.327 ; 1.676,-3.277 2.235,-3.277 ; 1.676,-2.464 1.981,-2.464 ; 1.676,-2.413 1.93,-2.413 ; 1.676,-2.362 1.829,-2.362 ; 1.676,-2.311 1.778,-2.311 ; 1.676,-1.702 2.997,-1.702 ; 1.676,2.87 1.981,2.87 ; 1.676,2.921 2.032,2.921 ; 1.676,2.972 2.083,2.972 ; 1.676,3.023 2.134,3.023 ; 1.676,3.073 2.184,3.073 ; 1.676,3.48 2.184,3.48 ; 1.676,3.531 2.184,3.531 ; 1.676,3.581 2.235,3.581 ; 1.676,3.632 2.235,3.632 ; 1.676,3.683 2.235,3.683 ; 1.676,3.734 2.286,3.734 ; 1.727,-3.581 2.388,-3.581 ; 1.727,-3.531 2.337,-3.531 ; 1.727,-3.48 2.286,-3.48 ; 1.727,-1.753 3.048,-1.753 ; 1.727,2.159 2.997,2.159 ; 1.727,2.718 1.778,2.718 ; 1.727,2.769 1.829,2.769 ; 1.727,2.819 1.93,2.819 ; 1.727,3.785 2.286,3.785 ; 1.727,3.835 2.286,3.835 ; 1.727,3.886 2.337,3.886 ; 1.778,-3.683 2.438,-3.683 ; 1.778,-3.632 2.388,-3.632 ; 1.778,-1.803 3.099,-1.803 ; 1.778,2.21 3.048,2.21 ; 1.778,3.937 2.337,3.937 ; 1.778,3.988 2.388,3.988 ; 1.778,4.039 2.438,4.039 ; 1.829,-3.785 2.54,-3.785 ; 1.829,-3.734 2.489,-3.734 ; 1.829,2.261 3.099,2.261 ; 1.829,4.089 2.438,4.089 ; 1.829,4.14 2.489,4.14 ; 1.88,-3.886 2.642,-3.886 ; 1.88,-3.835 2.591,-3.835 ; 1.88,-1.854 3.15,-1.854 ; 1.88,4.191 2.54,4.191 ; 1.88,4.242 2.591,4.242 ; 1.93,-3.937 2.692,-3.937 ; 1.93,-1.905 3.2,-1.905 ; 1.93,2.311 3.15,2.311 ; 1.93,4.293 2.642,4.293 ; 1.981,-3.988 2.794,-3.988 ; 1.981,-1.956 3.251,-1.956 ; 1.981,2.362 3.15,2.362 ; 1.981,4.343 2.692,4.343 ; 1.981,4.394 2.743,4.394 ; 2.032,-4.089 2.946,-4.089 ; 2.032,-4.039 2.845,-4.039 ; 2.032,-2.007 3.302,-2.007 ; 2.032,2.413 3.2,2.413 ; 2.032,4.445 2.845,4.445 ; 2.083,-4.14 3.099,-4.14 ; 2.083,2.464 3.251,2.464 ; 2.083,4.496 2.946,4.496 ; 2.134,-4.191 3.302,-4.191 ; 2.134,-2.057 3.353,-2.057 ; 2.134,4.547 3.048,4.547 ; 2.184,-4.242 4.826,-4.242 ; 2.184,-2.108 3.353,-2.108 ; 2.184,2.515 3.302,2.515 ; 2.184,4.597 3.15,4.597 ; 2.235,-4.293 4.775,-4.293 ; 2.235,-2.159 3.404,-2.159 ; 2.235,2.565 3.353,2.565 ; 2.235,4.648 3.454,4.648 ; 2.286,-2.21 3.454,-2.21 ; 2.286,2.616 3.404,2.616 ; 2.286,4.699 4.826,4.699 ; 2.337,-4.343 4.724,-4.343 ; 2.337,-2.261 3.505,-2.261 ; 2.337,2.667 3.454,2.667 ; 2.337,4.75 4.775,4.75 ; 2.388,-4.394 4.674,-4.394 ; 2.388,-2.311 3.556,-2.311 ; 2.388,2.718 3.505,2.718 ; 2.388,4.801 4.724,4.801 ; 2.438,-4.445 4.572,-4.445 ; 2.438,-2.362 3.658,-2.362 ; 2.438,2.769 3.556,2.769 ; 2.489,-2.413 3.708,-2.413 ; 2.489,2.819 3.607,2.819 ; 2.489,4.851 4.623,4.851 ; 2.54,-4.496 4.521,-4.496 ; 2.54,-2.464 3.759,-2.464 ; 2.54,2.87 3.658,2.87 ; 2.54,4.902 4.572,4.902 ; 2.591,-4.547 4.42,-4.547 ; 2.591,-2.515 3.81,-2.515 ; 2.591,2.921 3.708,2.921 ; 2.642,4.953 4.47,4.953 ; 2.692,-4.597 4.318,-4.597 ; 2.692,-2.565 3.861,-2.565 ; 2.692,2.972 3.759,2.972 ; 2.743,-2.616 3.912,-2.616 ; 2.743,3.023 3.81,3.023 ; 2.743,3.073 3.861,3.073 ; 2.743,5.004 4.369,5.004 ; 2.794,-2.667 3.962,-2.667 ; 2.794,3.124 3.912,3.124 ; 2.845,-4.648 4.216,-4.648 ; 2.845,-2.769 4.013,-2.769 ; 2.845,-2.718 3.962,-2.718 ; 2.845,3.175 3.962,3.175 ; 2.845,5.055 4.267,5.055 ; 2.896,-2.819 4.013,-2.819 ; 2.896,3.226 3.962,3.226 ; 2.946,-2.87 4.013,-2.87 ; 2.946,-1.092 4.267,-1.092 ; 2.946,-1.041 4.166,-1.041 ; 2.946,1.499 4.267,1.499 ; 2.946,3.277 4.013,3.277 ; 2.997,-4.699 4.064,-4.699 ; 2.997,-2.921 4.013,-2.921 ; 2.997,-1.143 4.369,-1.143 ; 2.997,1.549 4.369,1.549 ; 2.997,3.327 4.013,3.327 ; 2.997,5.105 4.115,5.105 ; 3.048,-2.972 4.013,-2.972 ; 3.048,-1.194 4.47,-1.194 ; 3.048,-0.991 3.962,-0.991 ; 3.048,1.448 4.115,1.448 ; 3.048,1.6 4.47,1.6 ; 3.048,3.378 4.013,3.378 ; 3.099,-3.023 4.013,-3.023 ; 3.099,-1.245 4.521,-1.245 ; 3.099,1.651 4.572,1.651 ; 3.099,3.429 4.013,3.429 ; 3.15,-3.073 4.013,-3.073 ; 3.15,-1.295 4.623,-1.295 ; 3.15,1.702 4.623,1.702 ; 3.15,3.48 4.013,3.48 ; 3.2,-3.124 3.962,-3.124 ; 3.2,-1.397 4.775,-1.397 ; 3.2,-1.346 4.674,-1.346 ; 3.2,1.753 4.724,1.753 ; 3.2,1.803 4.775,1.803 ; 3.2,3.531 4.013,3.531 ; 3.2,5.156 3.912,5.156 ; 3.251,-4.75 3.81,-4.75 ; 3.251,-3.175 3.962,-3.175 ; 3.251,-1.448 4.826,-1.448 ; 3.251,1.397 3.861,1.397 ; 3.251,1.854 4.826,1.854 ; 3.251,3.581 3.962,3.581 ; 3.302,-3.226 3.912,-3.226 ; 3.302,-0.94 3.708,-0.94 ; 3.302,1.905 4.877,1.905 ; 3.302,3.632 3.962,3.632 ; 3.353,3.683 3.912,3.683 ; 3.404,-3.277 3.861,-3.277 ; 3.454,3.734 3.861,3.734 ; 3.505,-3.327 3.708,-3.327 ; 3.759,-1.499 4.877,-1.499 ; 3.759,4.648 4.877,4.648 ; 3.81,-4.191 4.877,-4.191 ; 3.912,1.956 4.928,1.956 ; 3.962,-4.14 4.928,-4.14 ; 3.962,-1.549 4.928,-1.549 ; 3.962,4.597 4.928,4.597 ; 4.064,2.007 4.978,2.007 ; 4.115,-4.089 4.978,-4.089 ; 4.115,-1.6 4.978,-1.6 ; 4.115,4.547 4.978,4.547 ; 4.166,-1.651 5.029,-1.651 ; 4.166,2.057 5.029,2.057 ; 4.216,-4.039 5.029,-4.039 ; 4.216,4.496 5.029,4.496 ; 4.267,-3.988 5.08,-3.988 ; 4.267,-1.702 5.029,-1.702 ; 4.267,2.108 5.08,2.108 ; 4.267,4.445 5.08,4.445 ; 4.318,2.159 5.08,2.159 ; 4.369,-3.937 5.08,-3.937 ; 4.369,-1.753 5.08,-1.753 ; 4.369,4.394 5.131,4.394 ; 4.42,-3.886 5.131,-3.886 ; 4.42,-1.803 5.131,-1.803 ; 4.42,2.21 5.131,2.21 ; 4.42,4.343 5.131,4.343 ; 4.47,-3.835 5.182,-3.835 ; 4.47,-1.854 5.131,-1.854 ; 4.47,2.261 5.182,2.261 ; 4.47,4.293 5.182,4.293 ; 4.521,-3.785 5.182,-3.785 ; 4.521,-1.905 5.182,-1.905 ; 4.521,2.311 5.182,2.311 ; 4.521,4.242 5.232,4.242 ; 4.572,-3.734 5.232,-3.734 ; 4.572,-1.956 5.232,-1.956 ; 4.572,2.362 5.232,2.362 ; 4.572,4.191 5.232,4.191 ; 4.623,-3.683 5.232,-3.683 ; 4.623,-3.632 5.283,-3.632 ; 4.623,-2.057 5.283,-2.057 ; 4.623,-2.007 5.232,-2.007 ; 4.623,2.413 5.283,2.413 ; 4.623,4.14 5.283,4.14 ; 4.674,-3.581 5.283,-3.581 ; 4.674,-2.108 5.283,-2.108 ; 4.674,2.464 5.283,2.464 ; 4.674,2.515 5.283,2.515 ; 4.674,4.089 5.283,4.089 ; 4.724,-3.531 5.334,-3.531 ; 4.724,-3.48 5.334,-3.48 ; 4.724,-2.21 5.334,-2.21 ; 4.724,-2.159 5.283,-2.159 ; 4.724,2.565 5.334,2.565 ; 4.724,3.988 5.334,3.988 ; 4.724,4.039 5.334,4.039 ; 4.775,-3.429 5.334,-3.429 ; 4.775,-3.378 5.385,-3.378 ; 4.775,-2.311 5.334,-2.311 ; 4.775,-2.261 5.334,-2.261 ; 4.775,2.616 5.334,2.616 ; 4.775,2.667 5.385,2.667 ; 4.775,3.886 5.385,3.886 ; 4.775,3.937 5.334,3.937 ; 4.826,-3.327 5.385,-3.327 ; 4.826,-3.277 5.385,-3.277 ; 4.826,-3.226 5.385,-3.226 ; 4.826,-3.175 5.385,-3.175 ; 4.826,-2.464 5.385,-2.464 ; 4.826,-2.413 5.385,-2.413 ; 4.826,-2.362 5.385,-2.362 ; 4.826,2.718 5.385,2.718 ; 4.826,2.769 5.385,2.769 ; 4.826,2.819 5.385,2.819 ; 4.826,3.785 5.385,3.785 ; 4.826,3.835 5.385,3.835 ; 4.877,-3.124 5.436,-3.124 ; 4.877,-3.073 5.436,-3.073 ; 4.877,-3.023 5.436,-3.023 ; 4.877,-2.972 5.436,-2.972 ; 4.877,-2.921 5.436,-2.921 ; 4.877,-2.87 5.436,-2.87 ; 4.877,-2.819 5.436,-2.819 ; 4.877,-2.769 5.436,-2.769 ; 4.877,-2.718 5.436,-2.718 ; 4.877,-2.667 5.436,-2.667 ; 4.877,-2.616 5.436,-2.616 ; 4.877,-2.565 5.436,-2.565 ; 4.877,-2.515 5.385,-2.515 ; 4.877,2.87 5.436,2.87 ; 4.877,2.921 5.436,2.921 ; 4.877,2.972 5.436,2.972 ; 4.877,3.023 5.436,3.023 ; 4.877,3.581 5.436,3.581 ; 4.877,3.632 5.436,3.632 ; 4.877,3.683 5.436,3.683 ; 4.877,3.734 5.436,3.734 ; 4.928,3.073 5.436,3.073 ; 4.928,3.124 5.486,3.124 ; 4.928,3.175 5.486,3.175 ; 4.928,3.226 5.486,3.226 ; 4.928,3.277 5.486,3.277 ; 4.928,3.327 5.486,3.327 ; 4.928,3.378 5.486,3.378 ; 4.928,3.429 5.486,3.429 ; 4.928,3.48 5.436,3.48 ; 4.928,3.531 5.436,3.531